# Altium integrated library SubjuGator8.IntLib: 247 symbols (part 2 of 2) (continued)
## STM32F407ZGT6 (continued)
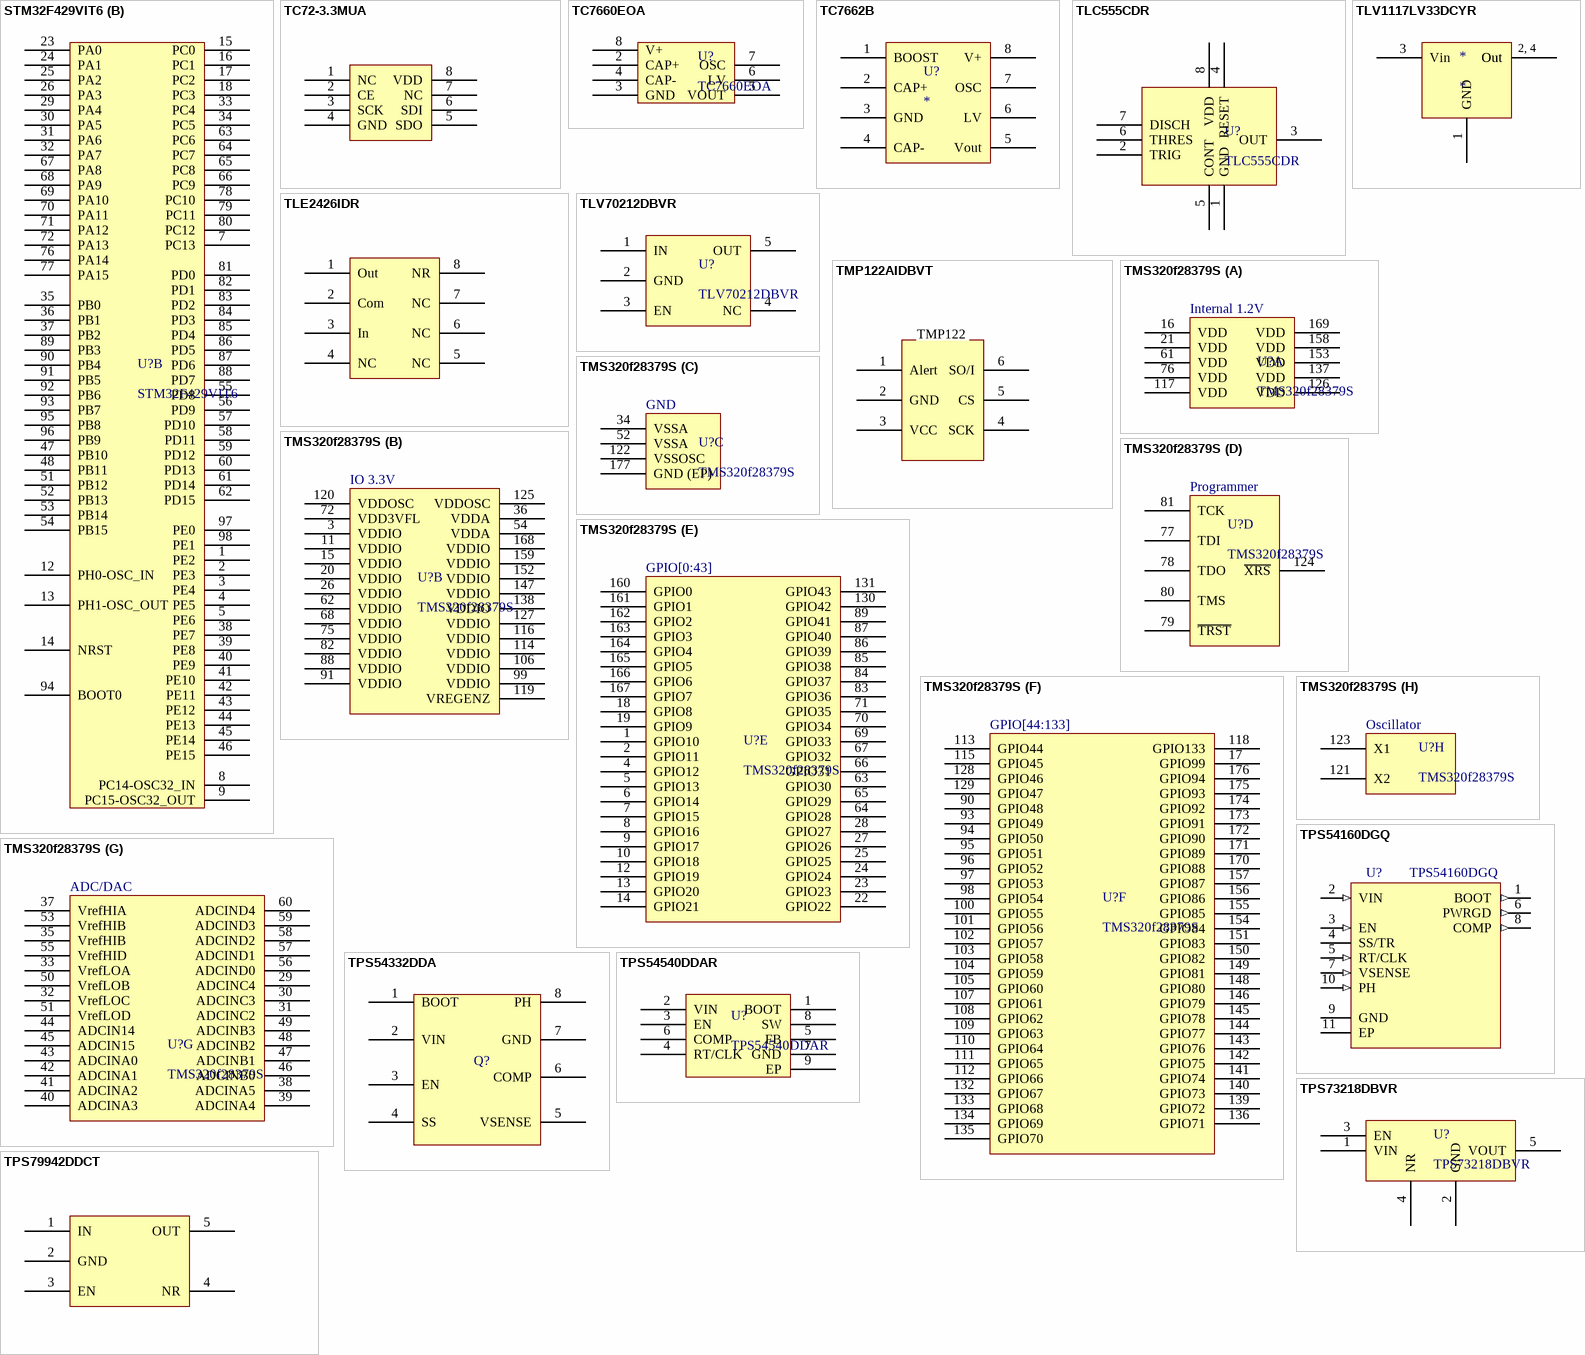
[diagram p10: symbols STM32F429VIT6 to TPS79942DDCT]

## STM32F429VIT6
designator U?
IC MCU ARM 2MB FLASH 100LQFP; Supplier 1: Digi-Key; Supplier Part Number 1: 497-14052-ND
footprint STM32F429VIT6 (TSQFP, 100-Leads, Body 14.00x14.00mm, Pitch 0.50mm, IPC Medium Density)
part A pins: 6 VBAT, 10 VSS, 11 VDD, 19 VDD, 20 VSSA, 21 VREF+, 22 VDDA, 27 VSS, 28 VDD, 49 VCAP_1, 50 VDD, 73 VCAP_2, 74 VSS, 75 VDD, 99 VSS, 100 VDD
part B pins: 1 PE2, 2 PE3, 3 PE4, 4 PE5, 5 PE6, 7 PC13, 8 PC14-OSC32_IN, 9 PC15-OSC32_OUT, 12 PH0-OSC_IN, 13 PH1-OSC_OUT, 14 NRST, 15 PC0, 16 PC1, 17 PC2, 18 PC3, 23 PA0, 24 PA1, 25 PA2, 26 PA3, 29 PA4, 30 PA5, 31 PA6, 32 PA7, 33 PC4, 34 PC5, 35 PB0, 36 PB1, 37 PB2, 38 PE7, 39 PE8, 40 PE9, 41 PE10, 42 PE11, 43 PE12, 44 PE13, 45 PE14, 46 PE15, 47 PB10, 48 PB11, 51 PB12, 52 PB13, 53 PB14, 54 PB15, 55 PD8, 56 PD9, 57 PD10, 58 PD11, 59 PD12, 60 PD13, 61 PD14, 62 PD15, 63 PC6, 64 PC7, 65 PC8, 66 PC9, 67 PA8, 68 PA9, 69 PA10, 70 PA11, 71 PA12, 72 PA13, 76 PA14, 77 PA15, 78 PC10, 79 PC11, 80 PC12, 81 PD0, 82 PD1, 83 PD2, 84 PD3, 85 PD4, 86 PD5, 87 PD6, 88 PD7, 89 PB3, 90 PB4, 91 PB5, 92 PB6, 93 PB7, 94 BOOT0, 95 PB8, 96 PB9, 97 PE0, 98 PE1

## TC72-3.3MUA
designator U?, comment TC72-3.3MUA-ND
SENSOR TEMPERATURE SPI 8MSOP; Supplier Part Number 1: TC72-3.3MUA-ND; Supplier 1: Digi-Key
footprint TC72 Temperature Sensor (TSOP, 8-Leads, Body 3.00x3.00mm, Pitch 0.65mm, IPC Medium Density)
pins: 1 NC, 2 CE, 3 SCK, 4 GND, 5 SDO, 6 SDI, 7 NC, 8 VDD

## TC7660EOA
designator U?
IC REG SWITCHD CAP INV ADJ 8SOIC; Supplier 1: Digi-key; Supplier Part Number 1: TC7660EOA-ND
footprint TC7660EOA
pins: 2 CAP+, 3 GND, 4 CAP-, 5 VOUT, 6 LV, 7 OSC, 8 V+

## TC7662B
designator U?
Charge Pump DC to DC Voltage Converter
footprint 8-SOIC (Used for LMH6612)
pins: 1 BOOST, 2 CAP+, 3 GND, 4 CAP-, 5 Vout, 6 LV, 7 OSC, 8 V+

## TLC555CDR
designator U?
IC OSC MONO TIMING 2.1MHZ 8-SOIC; Supplier 1: Digi-Key; Supplier Part Number 1: 296-1336-1-ND
footprint TLC555CDR
pins: 1 GND, 2 TRIG, 3 OUT, 4 RESET, 5 CONT, 6 THRES, 7 DISCH, 8 VDD

## TLE2426IDR
designator U?, comment VRef Adj 2-20V
IC VREF GND REF ADJ 8SOIC; Supplier 1: Digi-Key; Supplier Part Number 1: 296-1345-1-ND
footprint SOIC-8pin (For 296-1345-1-ND)
pins: 1 Out, 2 Com, 3 In, 4 NC, 5 NC, 6 NC, 7 NC, 8 NR

## TLV1117LV33DCYR
designator *
IC REG LINEAR 3.3V 1A SOT223-4; Digi-Key Part Number: 296-28778-1-ND
footprint SOT23-4N (SOT223, 4-Leads, Body 6.50x7.00mm (avg), Pitch 2.30mm, IPC Medium Density)
pins: 1 GND, 2 Out, 3 Vin, 4 Out
text: 2, 4

## TLV70212DBVR
designator U?
IC REG LDO 1.2V 0.3A SOT23-5; Supplier 1: Digi-Key; Supplier Part Number 1: 296-29583-1-ND
footprint SOT23-5N (For LP5907)
pins: 1 IN, 2 GND, 3 EN, 4 NC, 5 OUT

## TMP122AIDBVT
designator TMP?, comment 296-15178-1-ND
SPI Temperature Sensor
footprint TMP122AIDBVT (SOT23)
pins: 1 Alert, 2 GND, 3 VCC, 4 SCK, 5 CS, 6 SO/I
text: TMP122 / TMP122AIDBVT

## TMS320f28379S
designator U?
IC MCU 200MHZ FPU DSP; Supplier 1: Digi-Key; Supplier Part Number 1: TMS320F28379SPTPT-ND
footprint PQFP-177N (TSQFP, 176-Leads, Body 24.00x24.00mm, Pitch 0.50mm, Thermal Pad 8.07x7.33mm, IPC Medium Density)
part A pins: 16 VDD, 21 VDD, 61 VDD, 76 VDD, 117 VDD, 126 VDD, 137 VDD, 153 VDD, 158 VDD, 169 VDD
part B pins: 3 VDDIO, 11 VDDIO, 15 VDDIO, 20 VDDIO, 26 VDDIO, 36 VDDA, 54 VDDA, 62 VDDIO, 68 VDDIO, 72 VDD3VFL, 75 VDDIO, 82 VDDIO, 88 VDDIO, 91 VDDIO, 99 VDDIO, 106 VDDIO, 114 VDDIO, 116 VDDIO, 119 VREGENZ, 120 VDDOSC, 125 VDDOSC, 127 VDDIO, 138 VDDIO, 147 VDDIO, 152 VDDIO, 159 VDDIO, 168 VDDIO
part C pins: 34 VSSA, 52 VSSA, 122 VSSOSC, 177 GND (EP)
part D pins: 77 TDI, 78 TDO, 79 ~{TRST}, 80 TMS, 81 TCK, 124 ~{XRS}
part E pins: 1 GPIO10, 2 GPIO11, 4 GPIO12, 5 GPIO13, 6 GPIO14, 7 GPIO15, 8 GPIO16, 9 GPIO17, 10 GPIO18, 12 GPIO19, 13 GPIO20, 14 GPIO21, 18 GPIO8, 19 GPIO9, 22 GPIO22, 23 GPIO23, 24 GPIO24, 25 GPIO25, 27 GPIO26, 28 GPIO27, 63 GPIO30, 64 GPIO28, 65 GPIO29, 66 GPIO31, 67 GPIO32, 69 GPIO33, 70 GPIO34, 71 GPIO35, 83 GPIO36, 84 GPIO37, 85 GPIO38, 86 GPIO39, 87 GPIO40, 89 GPIO41, 130 GPIO42, 131 GPIO43, 160 GPIO0, 161 GPIO1, 162 GPIO2, 163 GPIO3, 164 GPIO4, 165 GPIO5, 166 GPIO6, 167 GPIO7
part F pins: 17 GPIO99, 90 GPIO48, 93 GPIO49, 94 GPIO50, 95 GPIO51, 96 GPIO52, 97 GPIO53, 98 GPIO54, 100 GPIO55, 101 GPIO56, 102 GPIO57, 103 GPIO58, 104 GPIO59, 105 GPIO60, 107 GPIO61, 108 GPIO62, 109 GPIO63, 110 GPIO64, 111 GPIO65, 112 GPIO66, 113 GPIO44, 115 GPIO45, 118 GPIO133, 128 GPIO46, 129 GPIO47, 132 GPIO67, 133 GPIO68, 134 GPIO69, 135 GPIO70, 136 GPIO71, 139 GPIO72, 140 GPIO73, 141 GPIO74, 142 GPIO75, 143 GPIO76, 144 GPIO77, 145 GPIO78, 146 GPIO79, 148 GPIO80, 149 GPIO81, 150 GPIO82, 151 GPIO83, 154 GPIO84, 155 GPIO85, 156 GPIO86, 157 GPIO87, 170 GPIO88, 171 GPIO89, 172 GPIO90, 173 GPIO91, 174 GPIO92, 175 GPIO93, 176 GPIO94
part G pins: 29 ADCINC4, 30 ADCINC3, 31 ADCINC2, 32 VrefLOC, 33 VrefLOA, 35 VrefHIB, 37 VrefHIA, 38 ADCINA5, 39 ADCINA4, 40 ADCINA3, 41 ADCINA2, 42 ADCINA1, 43 ADCINA0, 44 ADCIN14, 45 ADCIN15, 46 ADCINB0, 47 ADCINB1, 48 ADCINB2, 49 ADCINB3, 50 VrefLOB, 51 VrefLOD, 53 VrefHIB, 55 VrefHID, 56 ADCIND0, 57 ADCIND1, 58 ADCIND2, 59 ADCIND3, 60 ADCIND4
part H pins: 121 X2, 123 X1
part A text: Internal 1.2V
part B text: IO 3.3V
part C text: GND
part D text: Programmer
part E text: GPIO[0:43]
part F text: GPIO[44:133]
part G text: ADC/DAC
part H text: Oscillator

## TPS54160DGQ
designator U?
Buck Switching Regulator IC Positive Adjustable 0.8V 1 Output 1.5A 10-TFSOP, 10-MSOP _0.118, 3.00mm Width_ Exposed Pad; MF: Texas Instruments; Availability: Unavailable; Package: TFSOP-10 Texas Instruments; SnapEDA_Link: https://www.snapeda.com/parts/TPS54160DGQ/Texas%20Instruments/view-part/393939/?ref=snap; Price: None; Value: *; MP: TPS54160DGQ
footprint SOIC-11
pins: 1 BOOT (out), 2 VIN (in), 3 EN (in), 4 SS/TR (power), 5 RT/CLK (in), 6 PWRGD (out), 7 VSENSE (in), 8 COMP (out), 9 GND, 10 PH (in), 11 EP

## TPS54332DDA
designator Q?  (value not drawn)
IC REG BUCK ADJ 3.5A 8SOPWRPAD; Supplier 1: Digi-Key; Supplier Part Number 1: 296-24141-5-ND
footprint TPS54332DDA (IC REG BUCK ADJ 3.5A 8SOPWRPAD)
pins: 1 BOOT, 2 VIN, 3 EN, 4 SS, 5 VSENSE, 6 COMP, 7 GND, 8 PH

## TPS54540DDAR
designator U?
IC REG BUCK SPLIT RAIL 8SOPWRPAD; Manufacturer 1: Texas Instruments; Manufacturer Part Number 1: TPS54540DDAR; Supplier Part Number 1: 296-39422-1-ND; Supplier 1: Digi-Key
footprint SOIC-8 EP (SOIC, 8-Leads, Body 4.90x3.90mm, Pitch 1.27mm, Thermal Pad 3.10x2.40mm, IPC Medium Density)
pins: 1 BOOT, 2 VIN, 3 EN, 4 RT/CLK, 5 FB, 6 COMP, 7 GND, 8 SW, 9 EP

## TPS73218DBVR
designator U?
IC REG LDO 1.8V 0.25A SOT23-5; Manufacturer 1: Texas Instruments; Manufacturer Part Number 1: TPS73218DBVR; Supplier Part Number 1: 296-41770-1-ND; Supplier 1: Digi-Key
footprint SOT-23-5 (SOT23, 5-Leads, Body 2.90x2.80mm, Pitch 0.95mm, IPC Medium Density)
pins: 1 VIN, 2 GND (power), 3 EN, 4 NR, 5 VOUT

## TPS79942DDCT
designator U?, comment LDO 4.2V
IC REG LDO 4.2V 0.2A 5SOT; Supplier 1: Digi-Key; Supplier Part Number 1: 296-32585-1-ND
footprint SOT23127P600-8N (Logic Level Shifter)
pins: 1 IN, 2 GND, 3 EN, 4 NR, 5 OUT

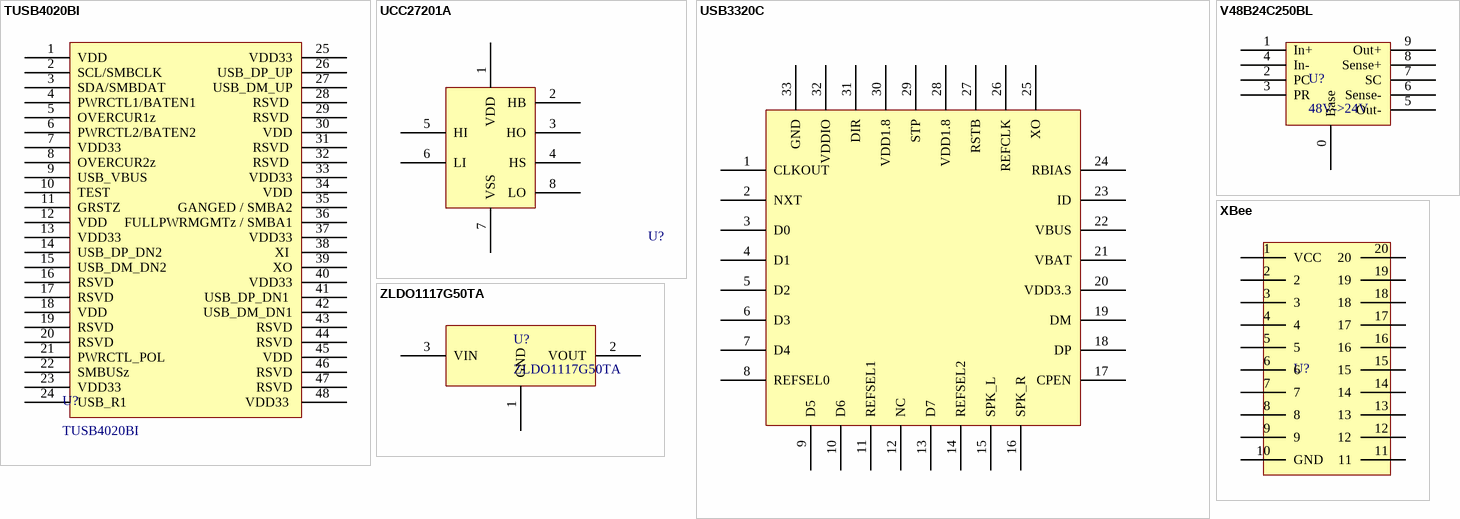
[diagram p11: symbols TUSB4020BI to ZLDO1117G50TA]

## TUSB4020BI
designator U?
IC USB 2.0 2PORT HUB IND 48HTQFP; Supplier 1: Digi-Key; Supplier Part Number 1: 296-43148-5-ND
footprint 48HTQFP (TSQFP, S-PQFP-G48, 48-Leads, Body 7.00x7.00mm, Pitch 0.50mm, IPC Medium Density)
pins: 1 VDD, 2 SCL/SMBCLK, 3 SDA/SMBDAT, 4 PWRCTL1/BATEN1, 5 OVERCUR1z, 6 PWRCTL2/BATEN2, 7 VDD33, 8 OVERCUR2z, 9 USB_VBUS, 10 TEST, 11 GRSTZ, 12 VDD, 13 VDD33, 14 USB_DP_DN2, 15 USB_DM_DN2 , 16 RSVD, 17 RSVD , 18 VDD, 19 RSVD, 20 RSVD, 21 PWRCTL_POL, 22 SMBUSz , 23 VDD33, 24 USB_R1 , 25 VDD33, 26 USB_DP_UP, 27 USB_DM_UP, 28 RSVD , 29 RSVD , 30 VDD, 31 RSVD , 32 RSVD , 33 VDD33, 34 VDD, 35 GANGED / SMBA2, 36 FULLPWRMGMTz / SMBA1, 37 VDD33, 38 XI , 39 XO, 40 VDD33, 41 USB_DP_DN1 , 42 USB_DM_DN1, 43 RSVD, 44 RSVD, 45 VDD, 46 RSVD, 47 RSVD, 48 VDD33 

## UCC27201A
designator U?  (value not drawn)
IC DVR HIGH/LOW SIDE 3A 8SOPWR; Supplier 1: Digi-Key; Supplier Part Number 1: 296-29356-1-ND
footprint UCC27201ADRMT (IC DVR HIGH/LOW SIDE 3A 8VSON)
footprint UCC27201A (120-V Boot, 3-A Peak, High Frequency, High-side/Low-side Driver)
pins: 1 VDD, 2 HB, 3 HO, 4 HS, 5 HI, 6 LI, 7 VSS, 8 LO

## USB3320C
designator U?
MULTI-FREQ USB 2.0 ULPI PHY; Supplier Part Number 1: USB3320C-EZK-ND; Supplier 1: Digi-Key
footprint QFN-32 (QFN, 32-Leads, Body 5.00x5.00mm, Pitch 0.50mm, Thermal Pad 3.30x3.30mm, IPC Medium Density)
pins: 1 CLKOUT, 2 NXT, 3 D0, 4 D1, 5 D2, 6 D3, 7 D4, 8 REFSEL0, 9 D5, 10 D6, 11 REFSEL1, 12 NC, 13 D7, 14 REFSEL2, 15 SPK_L, 16 SPK_R, 17 CPEN, 18 DP, 19 DM, 20 VDD3.3, 21 VBAT, 22 VBUS, 23 ID, 24 RBIAS, 25 XO, 26 REFCLK, 27 RSTB, 28 VDD1.8, 29 STP, 30 VDD1.8, 31 DIR, 32 VDDIO, 33 GND

## V48B24C250BL
designator U?, comment 48V->24V
CONVERTER MOD DC/DC 24V 250W; Supplier 1: Digi-Key; Supplier Part Number 1: 1102-1414-ND
footprint FASTRAK_MINI_ONBOARD_MOUNT
pins: 0 Base, 1 In+, 2 PC, 3 PR, 4 In-, 5 Out-, 6 Sense-, 7 SC, 8 Sense+, 9 Out+

## XBee
designator U?  (value not drawn)
XBee radio; Supplier 1: Digi-Key; Supplier Part Number 1: 602-1181-ND
footprint XBee
pins: 1 VCC, 2, 3, 4, 5, 6, 7, 8, 9, 10 GND, 11, 12, 13, 14, 15, 16, 17, 18, 19, 20

## ZLDO1117G50TA
designator U?
IC REG LDO 5V 1A SOT223-3; Supplier 1: Digi-Key; Supplier Part Number 1: ZLDO1117G50DICT-ND
footprint ZLDO1117G50TA
pins: 1 GND (power), 2 VOUT, 3 VIN


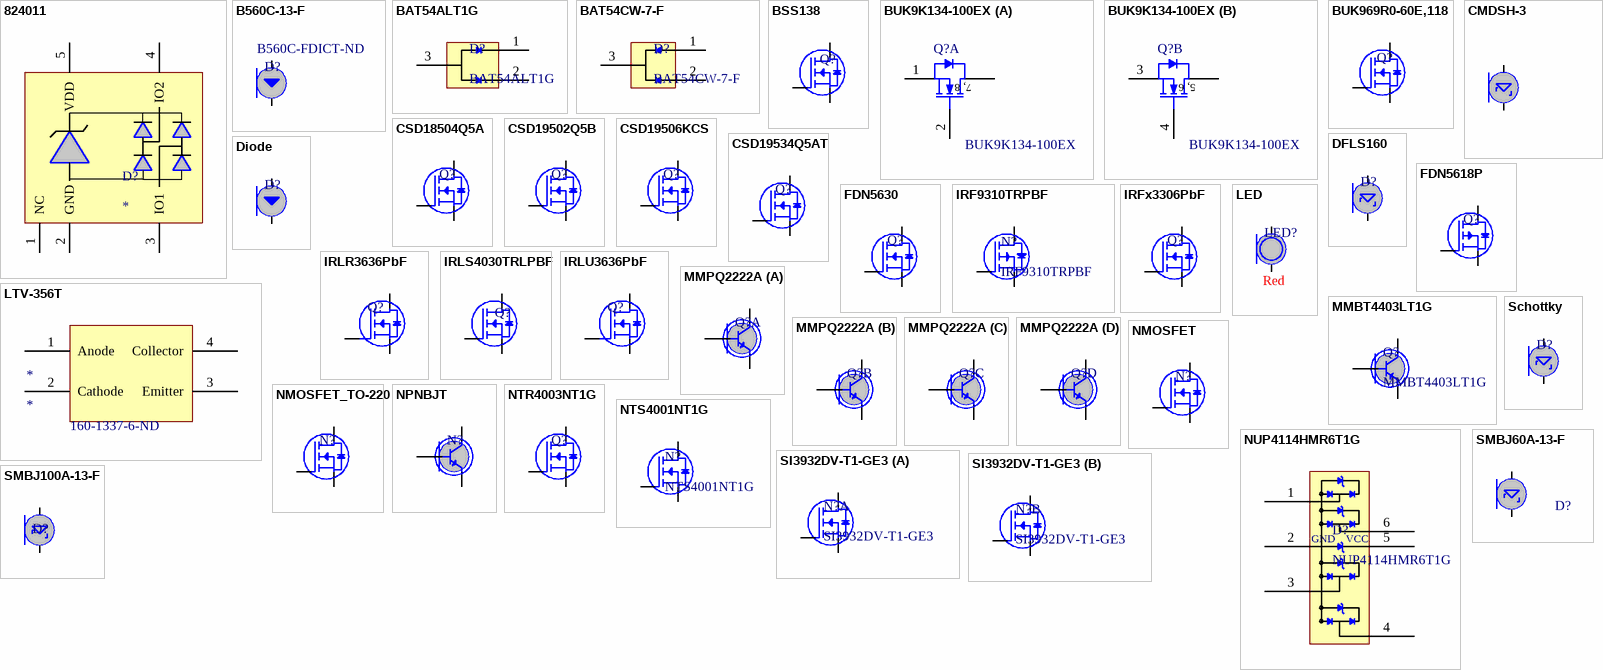
[diagram p12: symbols 824011 to SMBJ100A-13-F]

## 824011
designator D?
USB ESD Protection Diodes
footprint SOT95P280X116-5N (SOT23, 5-Leads, Body 2.90x2.80mm, Pitch 0.95mm, IPC Medium Density)
pins: 1 NC, 2 GND, 3 IO1, 4 IO2, 5 VDD

## B560C-13-F
designator D?  Supplier Part Number 1: B560C-FDICT-ND  (hidden comment: B560C-13-F)
DIODE SCHOTTKY 60V 5A SMC; Manufacturer 1: Diodes Incorporated; Supplier 1: Digi-Key; Manufacturer Part Number 1: B560C-13-F
footprint DO-214AB (Molded Diode, 2-Leads, Body 6.85x5.90mm, IPC Medium Density)
pins: A, C

## BAT54ALT1G
designator D?
DIODE ARRAY SCHOTTKY 30V SOT23-3; Manufacturer 1: ON Semiconductor; Manufacturer Part Number 1: BAT54ALT1G; Supplier 1: Digi-Key; Supplier Part Number 1: BAT54ALT1GOSCT-ND
footprint SOT-323 (SOT23, 3-Leads, Body 2.00x2.20mm, Pitch 0.65mm, IPC Medium Density)
pins: 1, 2, 3

## BAT54CW-7-F
designator D?
DIODE ARRAY SCHOTTKY 30V SOT323; Manufacturer 1: Diodes Incorporated; Manufacturer Part Number 1: BAT54CW-7-F; Supplier 1: Digi-Key; Supplier Part Number 1: BAT54CW-FDICT-ND
footprint SOT-323 (SOT23, 3-Leads, Body 2.00x2.20mm, Pitch 0.65mm, IPC Medium Density)
pins: 1, 2, 3

## BSS138
designator Q?  (value not drawn)
MOSFET N-CH 50V 220MA SOT-23; Supplier 1: Digi-Key; Supplier Part Number 1: BSS138CT-ND
footprint BSS138 (MOSFET N-CH 50V 220MA SOT-23)
pins: D, G, S

## BUK9K134-100EX
designator Q?
MOSFET DUAL N-CH 100V 8.5A SOT1205; Supplier 1: Digi-Key; Supplier Part Number 1: 568-11631-1-ND
footprint NXP_SOT1205 (TSOP, 8-Leads, Body 5.13x4.58mm, Pitch 1.27mm, Thermal Pad 2.00x2.00mm, IPC Medium Density)
part A pins: 1 S, 2 G, 7 D, 8 D
part B pins: 3 S, 4 G, 5 D, 6 D
part A text: 7, 8
part B text: 5, 6

## BUK969R0-60E,118
designator Q?  (value not drawn)
MOSFET N-CH 60V 75A D2PAK; Supplier 1: Digi-Key; Supplier Part Number 1: 568-9894-1-ND
pins: D, G, S

## CMDSH-3
designator D?, comment Schottky
DIODE SCHOTTKY 30V 100MA SOD323; Supplier 1: Digi-Key; Supplier Part Number 1: CMDSH-3 CT-ND
footprint SOD-323F (Molded Diode, 2-Leads, Body 1.70x1.25mm, IPC Medium Density)
pins: A, C

## CSD18504Q5A
designator Q?  (value not drawn)
MOSFET N-CH 40V 8SON; Manufacturer 1: Texas Instruments; Supplier 1: Digi-Key; Supplier Part Number 1: 296-30572-1-ND; Manufacturer Part Number 1: CSD18504Q5A
footprint CSD19502Q5B (PSON, 8-Leads, Body 5.00x6.00mm, Pitch 1.27mm, Thermal Pad 4.22x3.58mm, IPC Medium Density)
pins: D, G, S

## CSD19502Q5B
designator Q?  (value not drawn)
NEXFET Power MOSFET; Supplier 1: Digi-Key; Supplier Part Number 1: 296-37194-1-ND
footprint CSD19502Q5B (PSON, 8-Leads, Body 5.00x6.00mm, Pitch 1.27mm, Thermal Pad 4.22x3.58mm, IPC Medium Density)
pins: D, G, S

## CSD19506KCS
designator Q?  (value not drawn)
HEXFET Power MOSFET; Supplier 1: Digi-Key; Supplier Part Number 1: 296-37169-5-ND
footprint TO-220AB Heatsink (HEXFET Power MOSFET w/ Heat Sink)
footprint TO-220AB Heatsink Vertical
footprint TO-220AB Upside Down (High current FET installed like Devin's motor controllers)
footprint TO-220AB no heat sink (Vertically mounted FET without heatsink)
pins: D, G, S

## CSD19534Q5AT
designator Q?  (value not drawn)
MOSFET N-CH 100V 50 8SON; Manufacturer 1: Texas Instruments; Supplier 1: Digi-Key; Supplier Part Number 1: 296-37838-1-ND; Manufacturer Part Number 1: CSD19534Q5AT
footprint CSD19502Q5B (PSON, 8-Leads, Body 5.00x6.00mm, Pitch 1.27mm, Thermal Pad 4.22x3.58mm, IPC Medium Density)
pins: D, G, S

## DFLS160
designator D?  (value not drawn)
1.0A Surface Mount Schottky Barrier Rectifier; Supplier 1: Digi-Key; Supplier Part Number 1: DFLS160DICT-ND
footprint POWERDI123 (Diodes INC Power Diode)
footprint RSX501L-20TE25 (DIODE SCHOTTKY 20V 5A PMDS)
pins: A, C

## Diode
designator D?  (value not drawn)
Standard Diode Template
footprint TEMD5510FX01
footprint SOD-323F (Molded Diode, 2-Leads, Body 1.70x1.25mm, IPC Medium Density)
pins: A, C

## FDN5618P
designator Q?  (value not drawn)
60V P-Channel Logic Level PowerTrench MOSFET; Supplier 1: Digi-Key; Supplier Part Number 1: FDN5618PCT-ND
footprint PowerSOT-3 (SOT23, 3-Leads, Body 2.92x2.47mm, Pitch 0.95mm, IPC Medium Density)
pins: D, G, S

## FDN5630
designator Q?  (value not drawn)
60V N-Channel PowerTrench MOSFET; Supplier 1: Digi-Key; Supplier Part Number 1: FDN5630CT-ND
footprint PowerSOT-3 (SOT23, 3-Leads, Body 2.92x2.47mm, Pitch 0.95mm, IPC Medium Density)
pins: D, G, S

## IRF9310TRPBF
designator N?
MOSFET P-CH 30V 20A 8-SOIC; Manufacturer 1: Infineon Technologies; Supplier 1: Digi-Key; Supplier Part Number 1: IRF9310TRPBFCT-ND; Manufacturer Part Number 1: IRF9310TRPBF
footprint SOIC-8-NO-EP (SOIC, 8-Leads, Body 4.90x3.90mm, Pitch 1.27mm, IPC Medium Density)
pins: 1,2,3 S, 4 G, 5,6,7,8 D

## IRFx3306PbF
designator Q?, comment IRFB3306PbF  (value not drawn)
HEXFET Power MOSFET; Heatsink: A10755-ND; Supplier 1: Digi-Key; Supplier Part Number 1: IRFB3306PBF-ND
footprint TO-220AB Heatsink (HEXFET Power MOSFET w/ Heat Sink)
footprint TO-220AB Heatsink Vertical
footprint TO-220AB Upside Down (High current FET installed like Devin's motor controllers)
footprint TO-220AB no heat sink (Vertically mounted FET without heatsink)
pins: D, G, S

## IRLR3636PbF
designator Q?  (value not drawn)
HEXFET Power MOSFET; Supplier 1: Digi-Key; Supplier Part Number 1: IRLR3636TRPBFCT-ND
footprint IRLR3636PbF (D-PAK, 3-Pads, Body 6.2x6.7mm (max), IPC Medium Density)
pins: D, G, S

## IRLS4030TRLPBF
designator Q?  (value not drawn)
MOSFET N-CH 100V 180A D2PAK; Supplier 1: Digi-Key; Supplier Part Number 1: IRLS4030TRLPBFCT-ND
footprint IRLS4030TRLPBF (MOSFET N-CH 100V 180A D2PAK)
pins: D, G, S

## IRLU3636PbF
designator Q?  (value not drawn)
HEXFET Power MOSFET; Supplier 1: Digi-Key; Supplier Part Number 1: IRLU3636PBF-ND
footprint IRLU3636PbF
pins: D, G, S

## LED
designator LED?  Color: Red  (hidden comment: *)
Supplier 1: Digi-Key; Supplier Part Number 1: 754-1122-1-ND
footprint LED0603 (Chip LED, 2-Leads, Body 1.60x0.80mm, IPC Medium Density)
footprint LED1206
footprint LED0805 (Chip LED, 2-Leads, Body 2.00x1.25mm, IPC Medium Density)
pins: A, C

## LTV-356T
designator *  Supplier Part Number 1: 160-1337-6-ND
OPTOISOLATOR 3.75KV TRANS 4-SOP; Supplier 1: Digi-Key
footprint LTV-356T (OPTOISOLATOR 3.75KV TRANS 4-SOP)
pins: 1 Anode, 2 Cathode, 3 Emitter, 4 Collector

## MMBT4403LT1G
designator Q?
TRANS PNP 40V 0.6A SOT23; Manufacturer 1: ON Semiconductor; Manufacturer Part Number 1: MMBT4403LT1G; Supplier 1: Digi-Key; Supplier Part Number 1: MMBT4403LT1GOSCT-ND
footprint BZX84C24LT1G (SOT23, 3-Leads, Body 2.92x2.37mm, Pitch 0.95mm, IPC Medium Density)
pins: A B, B E, C

## MMPQ2222A
designator Q?  (value not drawn)
Quad NPN General Purpose Amplifier; Supplier 1: Digi-Key; Supplier Part Number 1: MMPQ2222ACT-ND
footprint MMPQ2222A (SOIC, 16-Leads, Body 9.90x3.90mm, Pitch 1.27mm, IPC Medium Density)
part A pins: 1 C1, 15 B1, 16 E1
part B pins: 3 C2, 13 B2, 14 E2
part C pins: 5 C3, 11 B3, 12 E3
part D pins: 7 C4, 9 B4, 10 E4

## NMOSFET
designator N?  (value not drawn)
NMOSFET Template; Supplier 1: Digi-Key; Supplier Part Number 1: 568-5818-1-ND
footprint 2N7002P,215 (MOSFET N-CH SGL 60V SOT-23)
pins: 1 G, 2 S, 3 D

## NMOSFET_TO-220
designator N?  (value not drawn)
NMOSFET_TO-220-Template; Supplier 1: Digi-Key; Supplier Part Number 1: IRLB3813PBF-ND
footprint TO-220AB no heat sink (Vertically mounted FET without heatsink)
footprint TO-220AB Heatsink (HEXFET Power MOSFET w/ Heat Sink)
footprint TO-220AB Heatsink Vertical (Vertical Heatsink for better heat management)
footprint TO-220AB Upside Down (High current FET installed like Devin's motor controllers)
pins: D, G, S

## NPNBJT
designator N?  (value not drawn)
NPN Transistor Template; Supplier 1: Digi-Key; Supplier Part Number 1: 568-4866-1-ND
footprint BC846A,215 (TRANSISTOR NPN 100MA 65V SOT23)
footprint PZT3904 (SOT223, 4-Leads, Body 6.45x7.00mm (avg), Pitch 2.30mm, IPC Medium Density)
pins: B, C, E

## NTR4003NT1G
designator Q?  (value not drawn)
MOSFET N-CH 30V 500MA SOT-23; Manufacturer 1: ON Semiconductor; Supplier 1: Digi-Key; Supplier Part Number 1: NTR4003NT1GOSCT-ND; Manufacturer Part Number 1: NTR4003NT1G
footprint BZX84C24LT1G (SOT23, 3-Leads, Body 2.92x2.37mm, Pitch 0.95mm, IPC Medium Density)
pins: A G, B S, C D

## NTS4001NT1G
designator N?
MOSFET N-CH 30V 270MA SOT-323; Manufacturer 1: ON Semiconductor; Manufacturer Part Number 1: NTS4001NT1G; Supplier 1: Digi-Key; Supplier Part Number 1: NTS4001NT1GOSCT-ND
footprint SOT-323 (SOT23, 3-Leads, Body 2.00x2.20mm, Pitch 0.65mm, IPC Medium Density)
pins: 1 G, 2 S, 3 D

## NUP4114HMR6T1G
designator D?
TVS DIODE 5.5VWM 10VC 6TSOP; Manufacturer 1: ON Semiconductor; Manufacturer Part Number 1: NUP4114HMR6T1G; Supplier 1: Digi-Key; Supplier Part Number 1: NUP4114HMR6T1GOSCT-ND
footprint TSOP-6 (SOT23, 6-Leads, Body 3.00x2.75mm, Pitch 0.95mm, IPC Medium Density)
pins: 1 IN1, 2 GND, 3 IN3, 4 IN4, 5 VCC, 6 IN2

## Schottky
designator D?  (value not drawn)
Schottky Diode Template
footprint 1N5819HW-7-F (DIODE SCHOTTKY 40V 1A SOD123)
footprint SS110-TP (DIODE SCHOTTKY 100V 1A SMA)
footprint DSS16UTR (Diode Schottky 60V 1A)
pins: A, C

## SI3932DV-T1-GE3
designator N?
MOSFET 2N-CH 30V 3.7A 6-TSOP; Manufacturer 1: Vishay Siliconix; Manufacturer Part Number 1: SI3932DV-T1-GE3; Supplier 1: Digi-Key; Supplier Part Number 1: SI3932DV-T1-GE3CT-ND
footprint SOT23-6 (SOT23, 6-Leads, Body 3.03x2.84mm, Pitch 0.95mm, IPC Medium Density)
part A pins: 1 G, 5 S, 6 D
part B pins: 2 S, 3 G, 4 D

## SMBJ60A-13-F
designator D?  (value not drawn)
TVS UNIDIRECT 600W 60V SMB; Supplier 1: Digi-Key; Supplier Part Number 1: SMBJ60A-FDIDKR-ND
footprint SMBJ60A-13-F (TVS UNIDIRECT 600W 60V SMB)
pins: A, C

## SMBJ100A-13-F
designator D?  (value not drawn)
TVS DIODE 100VWM 162VC SMB; Supplier 1: Digi-Key; Supplier Part Number 1: SMBJ100A-FDIDKR-ND
footprint SMBJ100A-13-F (TVS DIODE 100VWM 162VC SMB)
pins: A, C

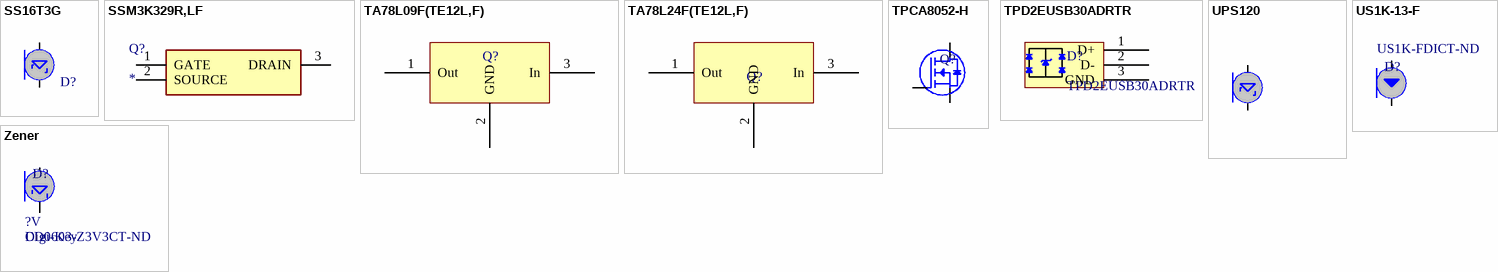
[diagram p13: symbols SS16T3G to Zener]

## SS16T3G
designator D?  (value not drawn)
DIODE SCHOTTKY 60V 1A SMA; Supplier 1: Digi-Key; Supplier Part Number 1: SS16T3GOSDKR-ND
footprint SS16T3G (DIODE SCHOTTKY 60V 1A SMA)
footprint SS110-TP (DIODE SCHOTTKY 100V 1A SMA)
pins: A, C

## SSM3K329R,LF
designator Q?
Transistor; Manufacturer_Name: Toshiba; Manufacturer_Part_Number: SSM3K329R,LF; Description: MOSFET SM Sig N-CH MOS 30V 3.5A 12V VGSS; Datasheet Link: https://toshiba.semicon-storage.com/info/docget.jsp?did=2157&prodName=SSM3K329R; Height: 0.88mm
footprint SOTFL95P240X88-3N
pins: 1 GATE, 2 SOURCE, 3 DRAIN

## TA78L09F(TE12L,F)
designator Q?  (value not drawn)
IC REG LDO 9V 0.15A PWMINI; Supplier 1: Digi-Key; Supplier Part Number 1: TA78L09F(TE12LF)DKR-ND
footprint TA78L09F(TE12L,F) (IC REG LDO 9V 0.15A PWMINI)
pins: 1 Out, 2 GND, 3 In

## TA78L24F(TE12L,F)
designator Q?, comment *TA78L24F(TE12L,F)  (value not drawn)
IC REG LDO 24V 0.15A PWMINI; Supplier 1: Digi-Key; Supplier Part Number 1: TA78L24F(TE12LF)DKR-ND
footprint TA78L09F(TE12L,F) (IC REG LDO 9V 0.15A PWMINI)
pins: 1 Out, 2 GND, 3 In

## TPCA8052-H
designator Q?, comment TPCA8052-H(TE12LQM  (value not drawn)
MOSFET N-CH 40V 20A 8SOP; Supplier 1: Digi-Key; Supplier Part Number 1: TPCA8052-H(TE12LQMDKR-ND
footprint TPCA8052-H(TE12LQM (MOSFET N-CH 40V 20A 8SOP)
pins: D, G, S

## TPD2EUSB30ADRTR
designator D?
TVS DIODE 3.6VWM 8VC SOT3; Manufacturer 1: Texas Instruments; Manufacturer Part Number 1: TPD2EUSB30ADRTR; Supplier 1: Digi-Key; Supplier Part Number 1: 296-28153-1-ND
footprint TPD2EUSB30ADRTR (TVS DIODE 3.6VWM 8VC SOT3)
pins: 1 D+, 2 D-, 3 GND

## UPS120
designator D?
DIODE SCHOTTKY 20V 1A POWERMITE1; Supplier 1: Digi-Key; Supplier Part Number 1: UPS120E3CT-ND
footprint DO-216AA (UPS120)
pins: A, C

## US1K-13-F
designator D?  Supplier Part Number 1: US1K-FDICT-ND  (hidden comment: *)
1.0A SURFACE MOUNT ULTRA-FAST RECTIFIER; Supplier 1: Digi-Key
footprint US1K-13-F (Molded Diode, 2-Leads, Body 4.3x2.6mm, IPC Medium Density)
pins: A, C

## Zener
designator D?  Zener Voltage: ?V  Supplier 1: Digi-Key  Supplier Part Number 1: CD0603-Z3V3CT-ND  (hidden comment: *)
Zener Diode
footprint LED0603 (Chip LED, 2-Leads, Body 1.60x0.80mm, IPC Medium Density)
footprint BZX84C24LT1G (SOT23, 3-Leads, Body 2.92x2.37mm, Pitch 0.95mm, IPC Medium Density)
pins: A, C